# Altium footprint library PCBLIB.PcbLib: 557 footprints (part 6 of 36)
Each footprint in its own frame and in the unit in brackets; x right, y up, seen from the top. Pads: shape width x height; smd on the part's side, far side on the other; paste and mask are expansions set on the pad; w line width, h text height; cw(c..) or ccw(c..) is an arc to the next point about the centre after c.
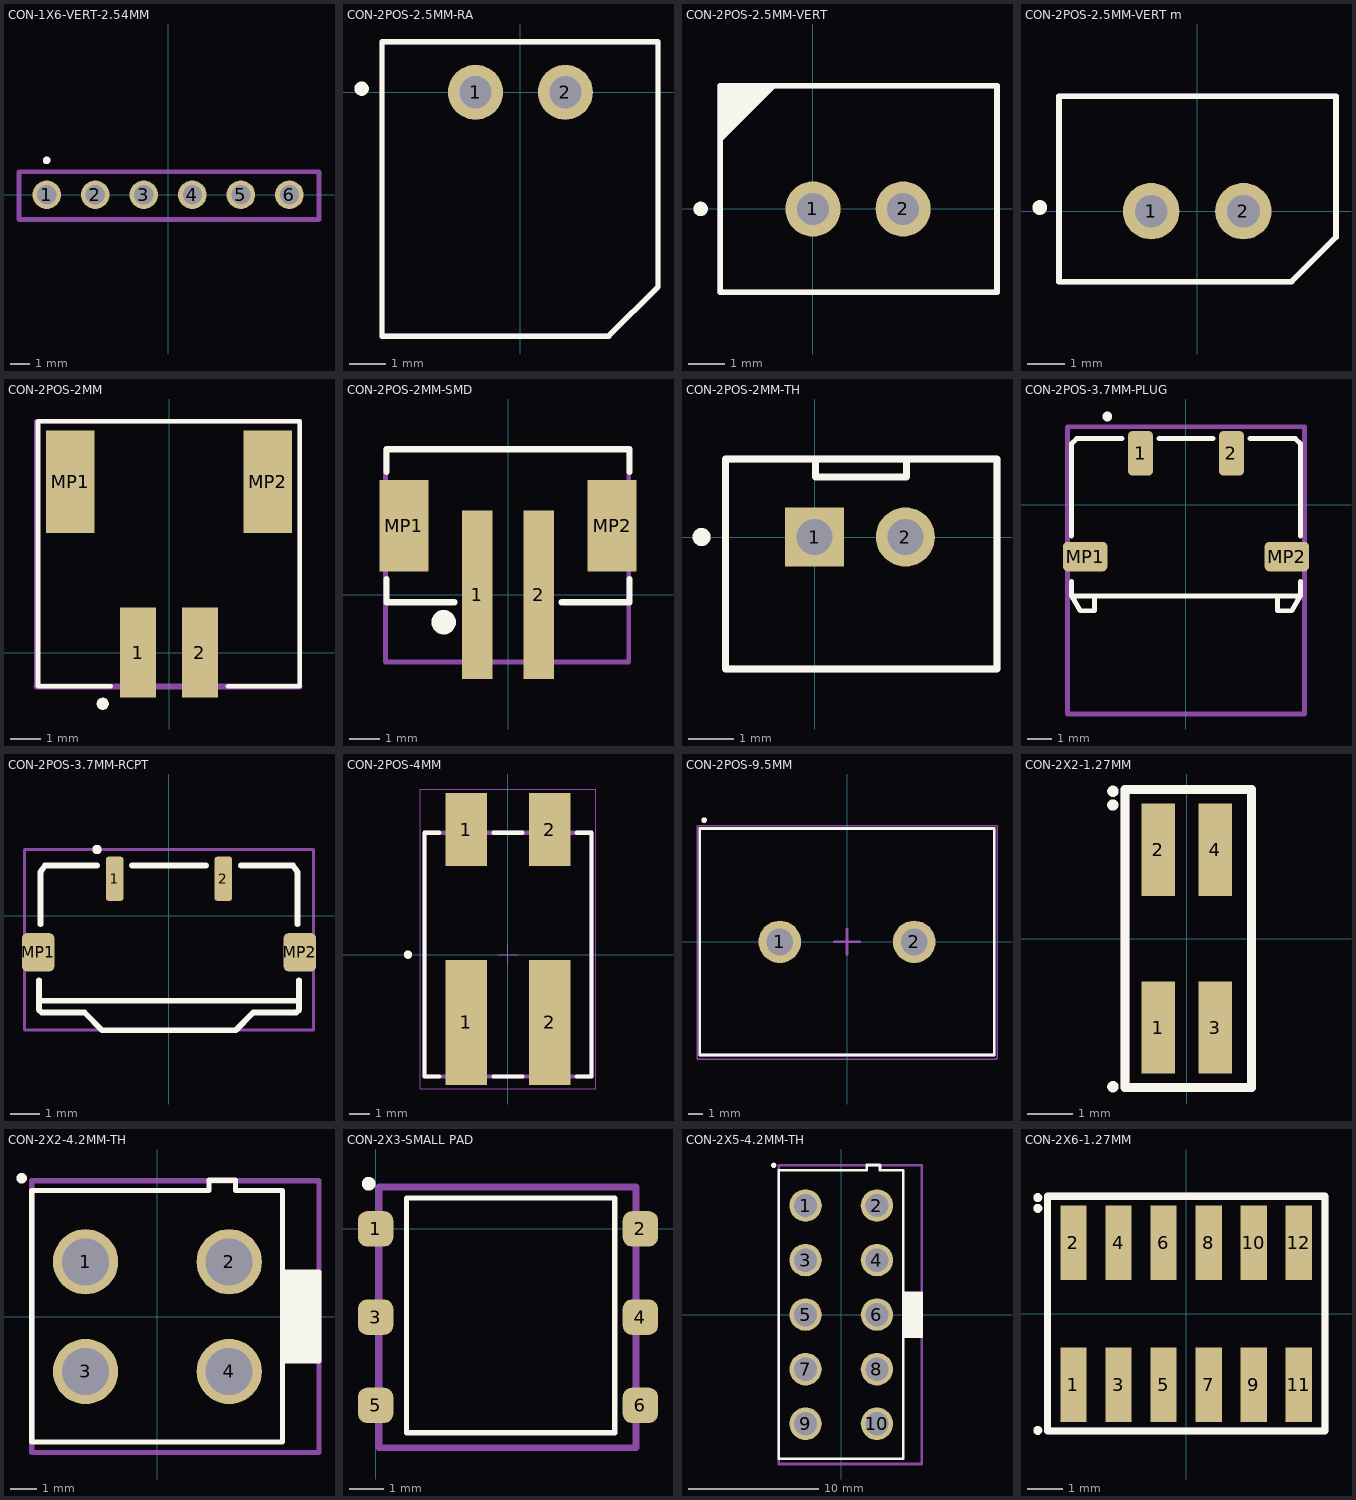
[diagram p5: the footprints below, top view; thin cyan lines are the x and y axes]

## CON-1X6-VERT-2.54MM [mm]
pads (6):
  round 1.5 hole 1: 1(-6.35,0) 2(-3.81,0) 3(-1.27,0) 4(1.27,0) 5(3.81,0) 6(6.35,0)
Top Overlay:
  circle w0.2: c-6.35,1.8 r0.1
MDA Layer:
  lines w0.2: -7.8,-1.3 7.9,-1.3 7.9,1.2 -7.8,1.2 -7.8,-1.3
ASM Top:
  lines w0.254: -7.8,-1.3 7.9,-1.3 7.9,1.2 -7.8,1.2 -7.8,-1.3
  text ".designator" at -1.28,0 h0.8
3D body "m20-7820646_asm.stp": height 8.51, standoff -2.99, extent -7.775,-1.27 7.865,1.23

## CON-2POS-2.5MM-RA [mil]
pads (2):
  round 60 hole 35: 1(-49,0) 2(49,0)
Top Overlay:
  circle w7.87: c-173.23,3.94 r3.94
  lines w5.91: -151,-266 -151,55 150,55 150,-212.2 96.2,-266 -151,-266
ASM Top:
  lines w5.91: -151,-266 -151,55 150,55 150,-212.2 96.2,-266 -151,-266
  text ".designator" at 111,-94 h31.5
3D body "022057025.stp": height 196.46, standoff -134.25, extent -146,-261.02 145.34,50

## CON-2POS-2.5MM-VERT [mil]
pads (2):
  round 60 hole 35: 1(0,0) 2(98,0)
Top Overlay:
  circle w7.87: c-122.05,0 r3.94
  region: -99.61,133.86 -99.61,72.86 -38.61,133.86
  lines w6: -100.61,-90.55 -100.61,133.86 200,133.86 200,-90.55 -100.61,-90.55
ASM Top:
  lines w6: -101,-90.55 200,-90.55 200,133.86 -101,133.86 -101,-90.55
  text ".designator" at -37.61,-7.87 h31.5

## CON-2POS-2.5MM-VERT m [mil]
pads (2):
  round 60 hole 35: 1(-49,0) 2(49,0)
Top Overlay:
  circle w7.87: c-167.54,3.94 r3.94
  lines w6: -147.06,-74.8 100.18,-74.8 147.43,-27.56 147.43,122.05 -147.06,122.05 -147.06,-74.8
ASM Top:
  lines w6: -147.06,-74.8 100.18,-74.8 147.43,-27.56 147.43,122.05 -147.06,122.05 -147.06,-74.8
  text ".designator" at -49,30 h31.5
3D body "022035025.stp": height 232.79, standoff -137.29, extent -143.92,-72.05 147.42,120.86

## CON-2POS-2MM [mm]
pads (4):
  rect 1.2x3 smd: 1(-1.029,0) 2(1.029,0)
  rect 1.6x3.4 smd: MP1(-3.28,5.67) MP2(3.28,5.67)
Top Overlay:
  circle w0.2: c-2.2,-1.7 r0.1
  lines w0.152: -1.931,-1.125 -4.35,-1.125 -4.35,7.68 4.34,7.68 4.34,-1.125 1.959,-1.125
ASM Top:
  lines w0.152: -4.4,-1.125 -4.4,7.68 4.34,7.68 4.34,-1.125
  lines w0.2: -4.4,-1.125 4.34,-1.125
  text ".designator" at -1.2,4.1 h0.8
3D body "S2B-PH-SM4-TB(LF)(SN)--3DModel-STEP-56544.STEP": height 5.63, standoff -0.34, extent -4,-1.37 3.9,7.466

## CON-2POS-2MM-SMD [mm]
pads (4):
  rect 1x5.5 smd: 1(-1,0) 2(1,0)
  rect 1.6x3 smd: MP1(-3.4,2.25) MP2(3.4,2.25)
Top Overlay:
  circle w0.4: c-2.1,-0.9 r0.2
  lines w0.2: -3.975,0.5 -3.975,-0.25 -1.75,-0.25 ; -3.975,4 -3.975,4.75 3.975,4.75 3.975,4 ; 1.75,-0.25 3.975,-0.25 3.975,0.5
ASM Top:
  lines w0.152: -4,-2.2 -4,4.725 -3.975,4.75 3.975,4.75 3.95,4.725 3.95,-2.2 3.85,-2.2 -4,-2.2
  text ".designator" at -1.5,1.5 h0.8
3D body "B2B-PH-SM4-TB.STEP": height 6.61, standoff 0.01, extent -4,-2.2 3.95,4.8

## CON-2POS-2MM-TH [mm]
pads (2):
  rect 1.308x1.308 hole 0.8: 1(0,0)
  round 1.308 hole 0.8: 2(2.006,0)
Top Overlay:
  circle w0.2: c-2.5,0 r0.1
  lines w0.152: 0.02,1.69 0.02,1.323 2.026,1.323 2.026,1.678 ; -1.969,-2.921 -1.969,1.729 4.031,1.729 4.031,-2.921 -1.969,-2.921
ASM Top:
  lines w0.152: -1.969,-2.921 -1.969,1.729 4.031,1.729 4.031,-2.921 -1.969,-2.921
  text ".designator" at 0.506,-0.6 h0.8
3D body "894000220.stp": height 6.07, standoff -3.38, extent -2.022,-2.96 3.978,1.69

## CON-2POS-3.7MM-PLUG [mm]
height 3
pads (4):
  rrect30% 1x1.8 smd: 1(-1.85,2.1) 2(1.85,2.1)
  rrect30% 1.8x1.2 smd: MP1(-4.1,-2.1) MP2(4.1,-2.1)
Top Overlay:
  circle w0.2: c-3.2,3.6 r0.1
  lines w0.2: -4.65,-3.1 -4.65,-3.7 ; -4.65,-1.27 -4.65,2.5 -4.45,2.7 -2.6,2.7 ; -3.725,-3.7 -3.725,-4.3 -4.3,-4.3 -4.65,-3.7 ; -1.1,2.7 1.1,2.7 ; 2.6,2.7 4.45,2.7 4.65,2.5 4.65,-1.27 ; 3.725,-3.7 3.725,-4.3 4.3,-4.3 4.65,-3.7 4.65,-3.1 ; 4.6,-3.7 0,-3.7 -4.65,-3.7
ASM Top:
  lines w0.2: -4.82,-8.5 4.6,-8.5 4.82,-8.5 4.82,3.18 -4.82,3.18 -4.82,-8.5
  text ".designator" at -1.5,-0.9 h0.8
3D body "5034690200.stp": height 3.01, standoff 0.01, extent -4.649,-8.5 4.651,2.7

## CON-2POS-3.7MM-RCPT [mm]
height 3
pads (4):
  rrect30% 0.6x1.5 smd: 1(-1.85,1.25) 2(1.85,1.25)
  rrect30% 1.1x1.3 smd: MP1(-4.45,-1.25) MP2(4.45,-1.25)
Top Overlay:
  circle w0.2: c-2.447,2.244 r0.058
  lines w0.2: -4.425,-2.9 4.425,-2.9 ; -4.425,-2.2 -4.425,-3.2 -4.325,-3.3 -2.875,-3.3 -2.275,-3.9 2.275,-3.9 2.866,-3.3 4.325,-3.3 4.425,-3.2 4.425,-2.2 ; -4.375,-0.297 -4.375,1.479 -4.225,1.7 -2.447,1.7 ; -1.258,1.7 1.253,1.7 ; 2.448,1.7 4.225,1.7 4.375,1.479 4.375,-0.297
ASM Top:
  circle w0.2: c-2.447,2.244 r0.058
  lines w0.1: -4.919,-3.9 4.919,-3.9 4.919,2.244 -4.919,2.244 -4.919,1.7 -4.919,-3.9
  text ".designator" at -1.258,-1.369 h0.8
3D body "5034710200.stp": height 3.01, standoff 0.01, extent -4.875,-3.9 4.875,1.7

## CON-2POS-4MM [mm] "SMT Horizontal Entry Connector, 2p"
height 2.3
pads (4):
  rect 2x6 smd: 1(-2,-3.25) 2(2,-3.25)
  rect 2x3.5 smd: 1(-2,6) 2(2,6)
Top Overlay:
  circle w0.2: c-4.8,0 r0.1
  lines w0.2: -3.3,-5.85 -4,-5.85 -4,5.85 -3.3,5.85 ; -0.7,-5.85 0.7,-5.85 ; -0.7,5.85 0.7,5.85 ; 3.3,-5.85 4,-5.85 4,5.85 3.3,5.85
Mechanical 15:
  lines w0.05: -0.5,0 0.5,0 ; 0,-0.5 0,0.5 ; -4.2,-6.45 4.2,-6.45 4.2,7.95 -4.2,7.95 -4.2,-6.45
ASM Top:
  lines w0.2: -4,-5.85 4,-5.85 4,5.85 -4,5.85 -4,-5.85
  text ".designator" at -0.5,0 h0.8
3D body "695402400222.stp": height 4.57, standoff -0.03, extent -4,-5.85 4,7.25

## CON-2POS-9.5MM [mm]
pads (2):
  round 3 hole 1.9 unplated: 1(-4.75,0) 2(4.75,0)
Top Overlay:
  circle w0.2: c-10.1,8.6 r0.1
  lines w0.2: -10.4,-8 10.4,-8 10.4,8 -10.4,8 -10.4,-8
Mechanical 15:
  lines w0.1: -10.6,-8.3 -10.6,8.2 10.6,8.2 10.6,-8.2 10.5,-8.3 -10.6,-8.3
  lines w0.2: -0.9,0 0,0 ; 0,-0.9 0,0 ; 0,0.9 0,0 ; 0.9,0 0,0
ASM Top:
  lines w0.2: -10.4,-8 -10.4,8 10.4,8 10.4,-8 -10.4,-8
  text ".designator" at -0.6,-0.2 h1.5
3D body "c-3-1437664-0-m-3d.stp": height 16.4, standoff -4.56, extent -10.3,-7.938 10.3,7.937

## CON-2X2-1.27MM [mm]
pads (4):
  rect 0.74x2.05 smd mask+0.05: 1(-0.635,-1.975) 2(-0.635,1.975) 3(0.635,-1.975) 4(0.635,1.975)
Top Overlay:
  circle w0.15: c-1.64,-3.29 r0.051
  circle w0.15: c-1.64,2.97 r0.051
  circle w0.15: c-1.64,3.275 r0.051
  lines w0.15: -1.372,2.845 -1.372,3.31
  lines w0.2: -1.372,-3.31 -1.372,3.31 1.445,3.31 1.445,-3.31 -1.372,-3.31
ASM Top:
  lines w0.2: -1.372,-3.31 -1.372,3.31 1.445,3.31 1.445,-3.31 -1.372,-3.31
  text ".designator" at 0.11,-0.25 h0.8
3D body "FLE-102-01-G-DV.stp": height 4.56, standoff 0.01, extent -1.327,-2.297 1.327,2.297

## CON-2X2-4.2MM-TH [mm]
pads (4):
  round 2.5 hole 1.8: 1(-2.75,2.1) 2(2.75,2.1) 3(-2.75,-2.1) 4(2.75,-2.1)
Top Overlay:
  circle w0.2: c-5.2,5.3 r0.1
  rectangle: 4.787,-1.7 6.187,1.7
  lines w0.2: 4.787,3.825 4.787,-4.8 ; 4.787,-4.8 -4.813,-4.8 -4.813,4.824 1.977,4.825 1.977,5.224 2.988,5.224 2.988,4.825 4.787,4.825 4.787,1.7 6.187,1.7 6.187,-1.7 4.787,-1.7 4.787,-4.8
ASM Top:
  lines w0.2: -4.812,-5.2 -4.812,5.2 6.188,5.2 6.188,-5.2 -4.812,-5.2
  text ".designator" at -1.5,0 h0.8
3D body "039288040.stp": height 12.81, standoff -3.49, extent -4.8,-5.2 6.2,5.2

## CON-2X3-SMALL PAD [mil]
pads (6):
  rrect50% 40x40 smd mask+2: 1(0,0) 2(300,0) 3(0,-100) 4(300,-100) 5(0,-200) 6(300,-200)
Top Overlay:
  circle w7.87: c-7.87,51.18 r3.94
  lines w6: 35,-231 271,-231 271,35 35,35 35,-231
ASM Top:
  lines w7.87: 3.94,-248.03 3.94,47.24 295.28,47.24 295.28,-248.03 3.94,-248.03
  text ".designator" at 118.11,-82.68 h31.5
3D body "HN2X3 SMD.STEP": height 493.41, standoff 0.5, extent 3.66,-248 295,49.34

## CON-2X5-4.2MM-TH [mm]
pads (10):
  round 2.5 hole 1.8: 1(-2.75,8.4) 2(2.75,8.4) 3(-2.75,4.2) 4(2.75,4.2) 5(-2.75,0) 6(2.75,0) 7(-2.75,-4.2) 8(2.75,-4.2) 9(-2.75,-8.4) 10(2.75,-8.4)
Top Overlay:
  circle w0.2: c-5.2,11.5 r0.1
  rectangle: 4.787,-1.7 6.187,1.7
  lines w0.2: 4.787,10.124 4.787,-1.7 ; 4.787,-1.7 6.187,-1.7 6.187,1.7 4.787,1.7 4.787,11.124 2.988,11.124 2.988,11.524 1.977,11.524 1.977,11.124 -4.813,11.124 -4.813,-11.1 4.787,-11.1 4.787,-1.7
ASM Top:
  lines w0.2: -4.812,-11.5 6.188,-11.5 6.188,11.5 -4.812,11.5 -4.812,-11.5
  text ".designator" at -1.524,-0.243 h0.8
3D body "039293106.stp": height 12.81, standoff -3.49, extent -4.8,-11.5 6.2,11.5

## CON-2X6-1.27MM [mm] "CONN HEADER SMD 12POS 1.27MM"
pads (12):
  rect 0.74x2.1 smd mask+0.05: 1(-3.175,-2) 2(-3.175,2) 3(-1.905,-2) 4(-1.905,2) 5(-0.635,-2) 6(-0.635,2) 7(0.635,-2) 8(0.635,2) 9(1.905,-2) 10(1.905,2) 11(3.175,-2) 12(3.175,2)
Top Overlay:
  circle w0.15: c-4.18,-3.29 r0.051
  circle w0.15: c-4.18,2.97 r0.051
  circle w0.15: c-4.18,3.275 r0.051
  lines w0.15: -3.912,2.845 -3.912,3.31
  lines w0.2: -3.912,-3.31 -3.912,3.31 3.912,3.31 3.912,-3.31 -3.912,-3.31
ASM Top:
  lines w0.2: -3.912,-3.31 -3.912,3.31 3.912,3.31 3.912,-3.31 -3.912,-3.31
  text ".designator" at -2.43,-0.25 h0.8
3D body "FTSH-106-01-F-DV-P-TR.stp": height 7, standoff 0.01, extent -3.81,-2.921 3.81,2.921